# Altium footprint library swatpcblib.PcbLib: 202 footprints (part 4 of 13)
Each footprint in its own frame and in the unit in brackets; x right, y up, seen from the top. Pads: shape width x height; smd on the part's side, far side on the other; paste and mask are expansions set on the pad; w line width, h text height; cw(c..) or ccw(c..) is an arc to the next point about the centre after c.
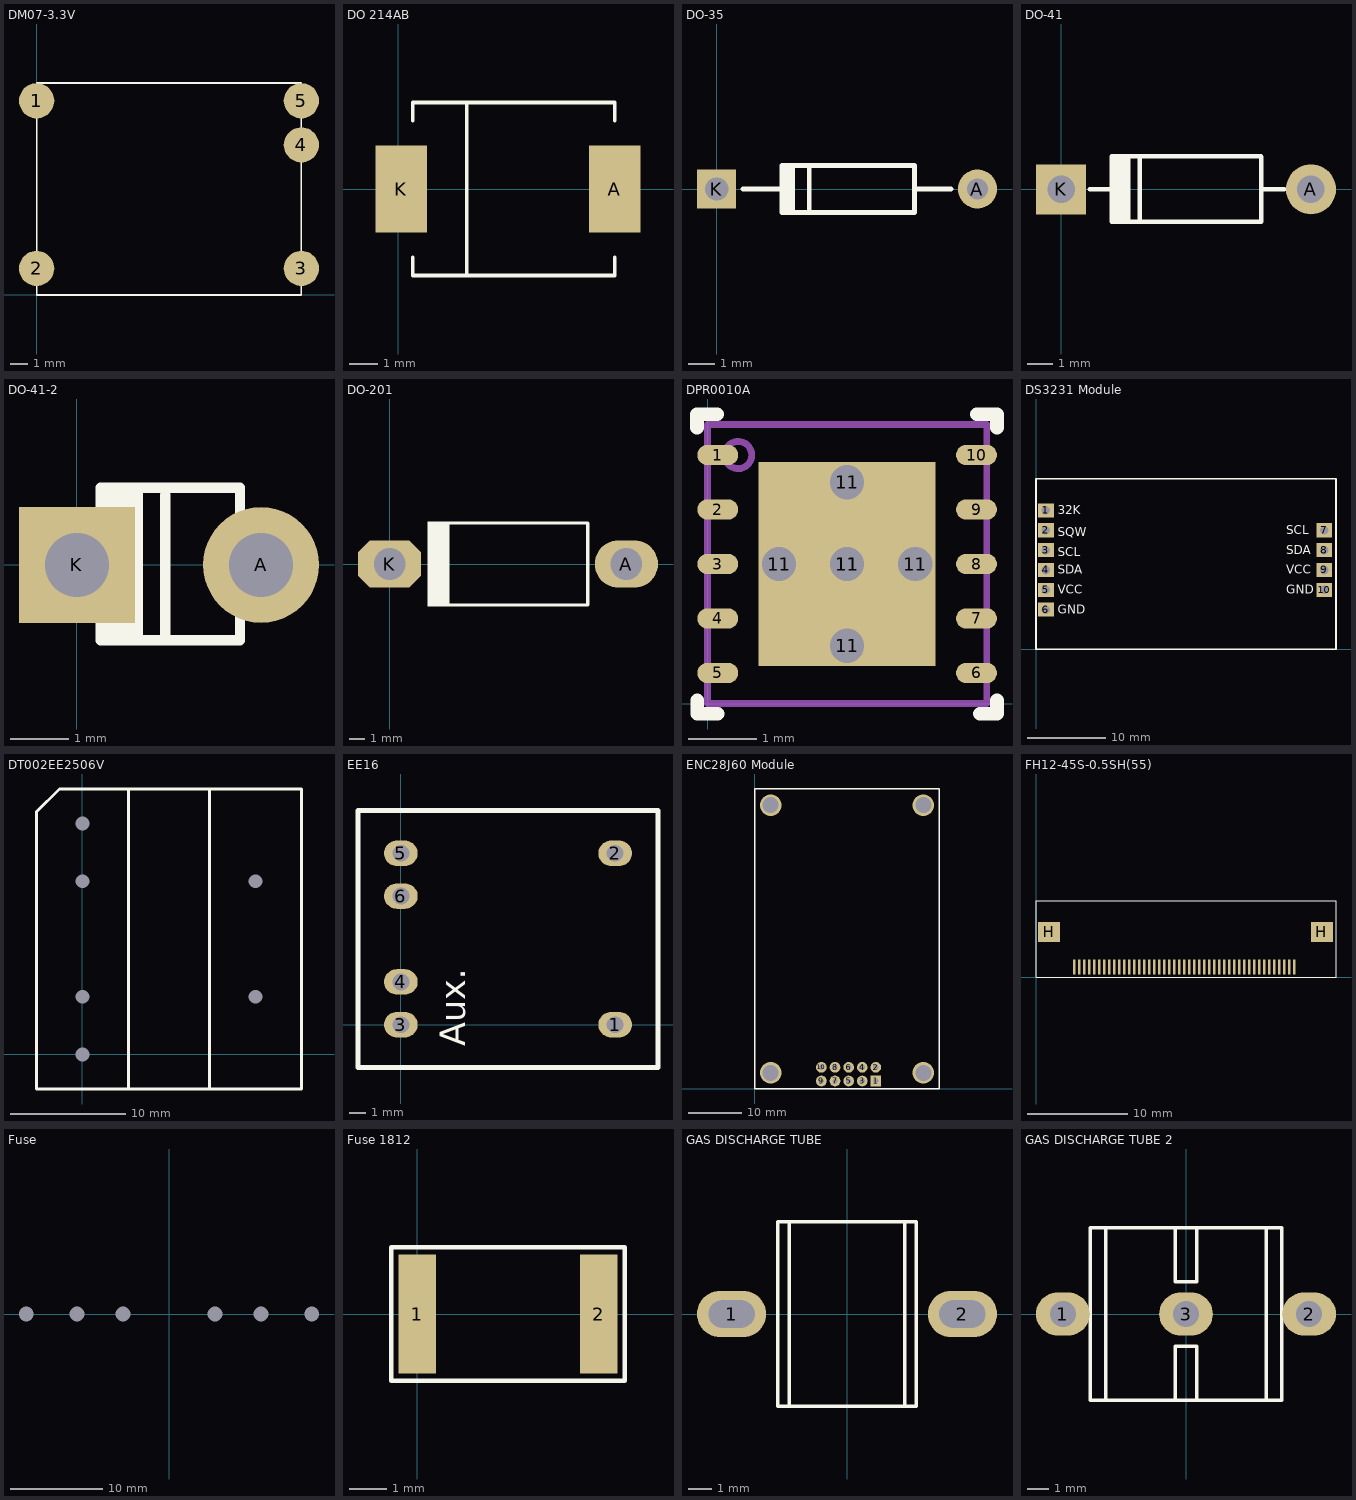
[diagram p3: the footprints below, top view; thin cyan lines are the x and y axes]

## DM07-3.3V [mm]
pads (5):
  round 2 smd: 1(0,11) 2(0,1.5) 3(15,1.5) 4(15,8.5) 5(15,11)
Top Overlay:
  lines w0.1: 0,0 0,12 15,12 15,0 0,0
3D body: height 3, standoff 0, extent 0,0 15.24,12.065

## DO 214AB [mm] "SS54 SS34"
pads (2):
  rect 1.8x3.048 smd: A(7.62,0) K(0.1,0)
Top Overlay:
  lines w0.127: 0.508,-2.413 0.508,-3.048 7.62,-3.048 7.62,-2.413 ; 0.508,2.413 0.508,3.048 7.62,3.048 7.62,2.413 ; 2.413,-3.048 2.413,3.048
Mechanical 1:
  lines w0.025: 0.508,-3.048 7.62,-3.048 ; 0.508,3.048 7.62,3.048
3D body "User Library-DIOM8261X24.STEP": height 2.4, standoff 0.03, extent -0.076,-3.048 8.054,3.052

## DO-35 [mm] "1N4148"
pads (2):
  round 1.5 hole 0.8: A(10,0)
  rect 1.5x1.5 hole 0.9: K(0,0)
Top Overlay:
  rectangle: 2.492,-0.9 3,0.9
  lines w0.178: 1,0 2.505,0 ; 2.505,-0.406 2.505,0 ; 2.505,0.533 2.505,0 ; 3.546,-0.9 3.546,0.9 ; 7.585,0 9,0 ; 2.505,0 2.505,0.9 7.585,0.9 7.585,-0.9 2.505,-0.9 2.505,0
3D body "SW3dPS-do_35.STEP": height 2.15, standoff -2.54, extent -0.426,-0.876 10.267,0.876

## DO-41 [mm] "1N4007"
pads (2):
  round 2 hole 1.1: A(10,0)
  rect 2x2 hole 1.1: K(0,0)
Top Overlay:
  rectangle: 2.013,-1.3 2.775,1.3
  lines w0.178: 1.149,0 2.038,0 ; 2.038,-0.787 2.038,0 ; 2.038,0.813 2.038,0 ; 3.156,-1.2 3.156,1.2 ; 8,-1.3 2.038,-1.3 2.038,1.325 8,1.325 ; 8.017,-1.3 8.017,1.305 ; 8.017,0.003 8.931,0.003
3D body "SW3DPS-DIODE0_4-DEFAULT.STEP": height 2.55, standoff -2.54, extent -0.4,-1.283 10.522,1.283

## DO-41-2 [mm]
pads (2):
  round 2 hole 1.1: A(3.175,0)
  rect 2x2 hole 1.1: K(0,0)
Top Overlay:
  rectangle: 0.381,-1.297 1.143,1.303
  lines w0.178: 0.406,-0.785 0.406,0.003 0.406,0.815 ; 1.524,-1.197 1.524,1.203 ; 0.406,-1.297 0.406,1.328 2.813,1.328 2.813,-1.297 0.406,-1.297
3D body "SW3dPS-1N4007_Stand.STEP": height 7.39, standoff -1, extent -0.394,-1.333 3.874,1.334

## DO-201 [mm] "1N5822, FR307"
height 5.4
pads (2):
  oval 4x3 hole 2: A(15,0)
  oct 4x3 hole 2: K(0,0)
Top Overlay:
  region: 3.797,2.7 2.4,2.7 2.4,-2.7 3.797,-2.7
  lines w0.2: 2.538,2.032 2.538,2.6 12.546,2.6 12.546,-2.6 2.665,-2.6
3D body "User Library-BYW98.step": height 6.3, standoff -2.35, extent -0.557,-2.65 15.743,2.65

## DPR0010A [mm]
pads (16):
  oval 0.6x0.3 smd paste-0.102 mask+0.051: 1(0.15,3.65) 2(0.15,2.85) 3(0.15,2.05) 4(0.15,1.25) 5(0.15,0.45) 6(3.95,0.45) 7(3.95,1.25) 8(3.95,2.05) 9(3.95,2.85) 10(3.95,3.65)
  round 0.5 hole 0.5 mask+0.051: 11(1.05,2.05) 11(2.05,0.85) 11(2.05,2.05) 11(2.05,3.25) 11(3.05,2.05)
  rect 2.6x3 smd paste-1.3 mask+0.051: 11(2.05,2.05)
Top Overlay:
  lines w0.2: -0.155,4.05 -0.155,4.25 0.145,4.25 ; -0.15,0.05 -0.15,-0.15 0.15,-0.15 ; 3.95,4.25 4.25,4.25 4.25,4.05 ; 4,-0.15 4.25,-0.15 4.25,0.05
Top Paste:
  region: 2.15,3.46 2.15,2.15 3.298,2.15 3.298,3.46
  region: 1.95,2.15 1.95,3.46 0.802,3.46 0.802,2.15
  region: 1.95,0.64 1.95,1.95 0.802,1.95 0.802,0.64
  region: 2.15,1.95 2.15,0.64 3.298,0.64 3.298,1.95
Mechanical 1:
  circle w0.1: c0.45,3.65 r0.2
  lines w0.1: 0,0 0,4.1 4.1,4.1 4.1,0 0,0
3D body "DPR0010A.stp": height 0.8, standoff 0, extent 0.05,0.05 4.05,4.05

## DS3231 Module [mm]
pads (10):
  rect 2x1.8 hole 1.1: 1(1.27,17.78) 2(1.27,15.24) 3(1.27,12.7) 4(1.27,10.16) 5(1.27,7.62) 6(1.27,5.08) 7(36.83,15.24) 8(36.83,12.7) 9(36.83,10.16) 10(36.83,7.62)
Top Overlay:
  lines w0.2: 0,0 38.354,0 38.354,21.844 0,21.844 0,0
  text "SCL" at 32.004,14.732 h1.14
  text "SCL" at 2.794,11.938 h1.14
  text "SDA" at 32.004,12.192 h1.14
  text "SDA" at 2.794,9.652 h1.14
  text "VCC" at 2.794,7.112 h1.14
  text "VCC" at 32.004,9.652 h1.14
  text "GND" at 32.004,7.112 h1.14
  text "GND" at 2.794,4.572 h1.14
  text "SQW" at 2.794,14.478 h1.14
  text "32K" at 2.794,17.272 h1.14
3D body "DS3231 Timer Assembly.stp": height 19, standoff 1.37, extent 0,0 38.34,21.8

## DT002EE2506V [mm] "Chikara"
pads (6):
  rect 0x0 / inner rect 2x2 / far side rect 2x2 hole 1.2: 1(0,20)
  round 0 / inner round 2 / far side round 2 hole 1.2: 2(0,15) 4(0,5) 5(0,0) 7(15,5) 9(15,15)
Top Overlay:
  lines w0.254: 4,-3 4,23 ; 11,-3 11,23 ; -4,-3 -4,21 -2,23 19,23 19,-3 -4,-3
3D body: height 22, standoff 0, extent -2,-3 17,23

## EE16 [mm] "Transformer Flyback"
pads (6):
  oval 2x1.5 hole 1: 1(12.7,0) 2(12.7,10.16) 3(0,0) 4(0,2.54) 5(0,10.16) 6(0,7.62)
Top Overlay:
  lines w0.3: -2.54,-2.54 15.24,-2.54 15.24,12.7 -2.54,12.7 -2.54,-2.54
  text ".Pri" at 3.81,6.35 h1.52
  text "Aux." at 3.81,-1.27 h1.52
  text ".Sec" at 12.7,1.27 h1.52
3D body "User Library-ee-16l.STEP": height 13.5, standoff -3.5, extent -1.65,-2.92 14.35,13.08

## ENC28J60 Module [mm]
pads (10):
  rect 2x2 hole 1: 1(22.631,1.499)
  round 2 hole 1: 2(22.631,4.039) 3(20.091,1.499) 4(20.091,4.039) 5(17.551,1.499) 6(17.551,4.039) 7(15.011,1.499) 8(15.011,4.039) 9(12.471,1.499) 10(12.471,4.039)
via 3,3 diameter 4 hole 3
via 31.5,3 diameter 4 hole 3
via 31.5,53 diameter 4 hole 3
via 3,53 diameter 4 hole 3
Top Overlay:
  lines w0.254: 0,0 34.5,0 34.5,56 0,56 0,0
3D body "User Library-ENC28J60-Module.STEP": height 14.4, standoff -2.1, extent 0,0 34.5,57.282

## FH12-45S-0.5SH(55) [mm] "45 Position FFC, FPC Connector Contacts, Bottom 0.020\" (0.50mm) Surface Mount, Right Angle"
pads (47):
  rect 0.25x1.5 smd: 1(3.81,1.016) 2(4.31,1.016) 3(4.81,1.016) 4(5.31,1.016) 5(5.81,1.016) 6(6.31,1.016) 7(6.81,1.016) 8(7.31,1.016) 9(7.81,1.016) 10(8.31,1.016) 11(8.81,1.016) 12(9.31,1.016) 13(9.81,1.016) 14(10.31,1.016) 15(10.81,1.016) 16(11.31,1.016) 17(11.81,1.016) 18(12.31,1.016) 19(12.81,1.016) 20(13.31,1.016) 21(13.81,1.016) 22(14.31,1.016) 23(14.81,1.016) 24(15.31,1.016) 25(15.81,1.016) 26(16.31,1.016) 27(16.81,1.016) 28(17.31,1.016) 29(17.81,1.016) 30(18.31,1.016) 31(18.81,1.016) 32(19.31,1.016) 33(19.81,1.016) 34(20.31,1.016) 35(20.81,1.016) 36(21.31,1.016) 37(21.81,1.016) 38(22.31,1.016) 39(22.81,1.016) 40(23.31,1.016) 41(23.81,1.016) 42(24.31,1.016) 43(24.81,1.016) 44(25.31,1.016) 45(25.81,1.016)
  rect 2.2x2 smd: H(1.31,4.516) H(28.56,4.516)
Top Overlay:
  lines w0.1: 0,0 29.972,0 29.972,7.62 0,7.62 0,0
3D body "FH12-45S-0.5SH.stp": height 2.12, standoff 0.01, extent 1.499,1.169 28.099,7.569

## Fuse [mm]
pads (6):
  round 0 / inner round 0 / far side round 3 hole 1.6: 1(-15.5,0) 1(-10,0) 1(-5,0) 2(5,0) 2(10,0) 2(15.5,0)
3D body "SW3DPS-FUSE-DEFAULT.step": height 8.84, standoff -4.01, extent -15.33,-2.896 15.55,3.009

## Fuse 1812 [mm]
pads (2):
  rect 1x3.2 smd: 1(0,0) 2(4.9,0)
Top Overlay:
  lines w0.127: -0.7,-1.8 -0.7,1.8 5.6,1.8 5.6,-1.8 -0.7,-1.8
3D body "User Library-fuse1812.step": height 1.28, standoff -0.04, extent -0.01,-1.61 4.81,1.61

## GAS DISCHARGE TUBE [mm] "2RMxxx"
pads (2):
  oval 3x2 hole 1.2 slot 2 at 0 deg: 1(-5,0) 2(5,0)
Top Overlay:
  lines w0.15: -2.5,-4 -2.5,4 ; 2.5,-4 2.5,4 ; -3,-4 -3,4 3,4 3,-4 -3,-4
3D body "User Library-gdt - epcos es.step": height 6.7, standoff -3, extent -2.55,-2.35 2.55,2.35

## GAS DISCHARGE TUBE 2 [mm]
pads (3):
  oval 2.5x2 hole 1.2: 1(-5.715,0) 2(5.715,0) 3(0,0)
Top Overlay:
  lines w0.15: -3.73,-4 -3.73,4 ; -0.5,-4 -0.5,-3.5 -0.5,-1.5 0.5,-1.5 0.5,-4 ; -0.5,4 -0.5,1.5 0.5,1.5 0.5,4 ; 3.73,-4 3.73,4 ; -4.445,-4 -4.445,4 4.445,4 4.445,-4 -4.445,-4
3D body "67237.stp": height 8, standoff -7, extent -6.947,-3.999 6.947,3.999